# Altium footprint library hphonglib.PcbLib: 1250 footprints (part 70 of 79)
Each footprint in its own frame and in the unit in brackets; x right, y up, seen from the top. Pads: shape width x height; smd on the part's side, far side on the other; paste and mask are expansions set on the pad; w line width, h text height; cw(c..) or ccw(c..) is an arc to the next point about the centre after c.
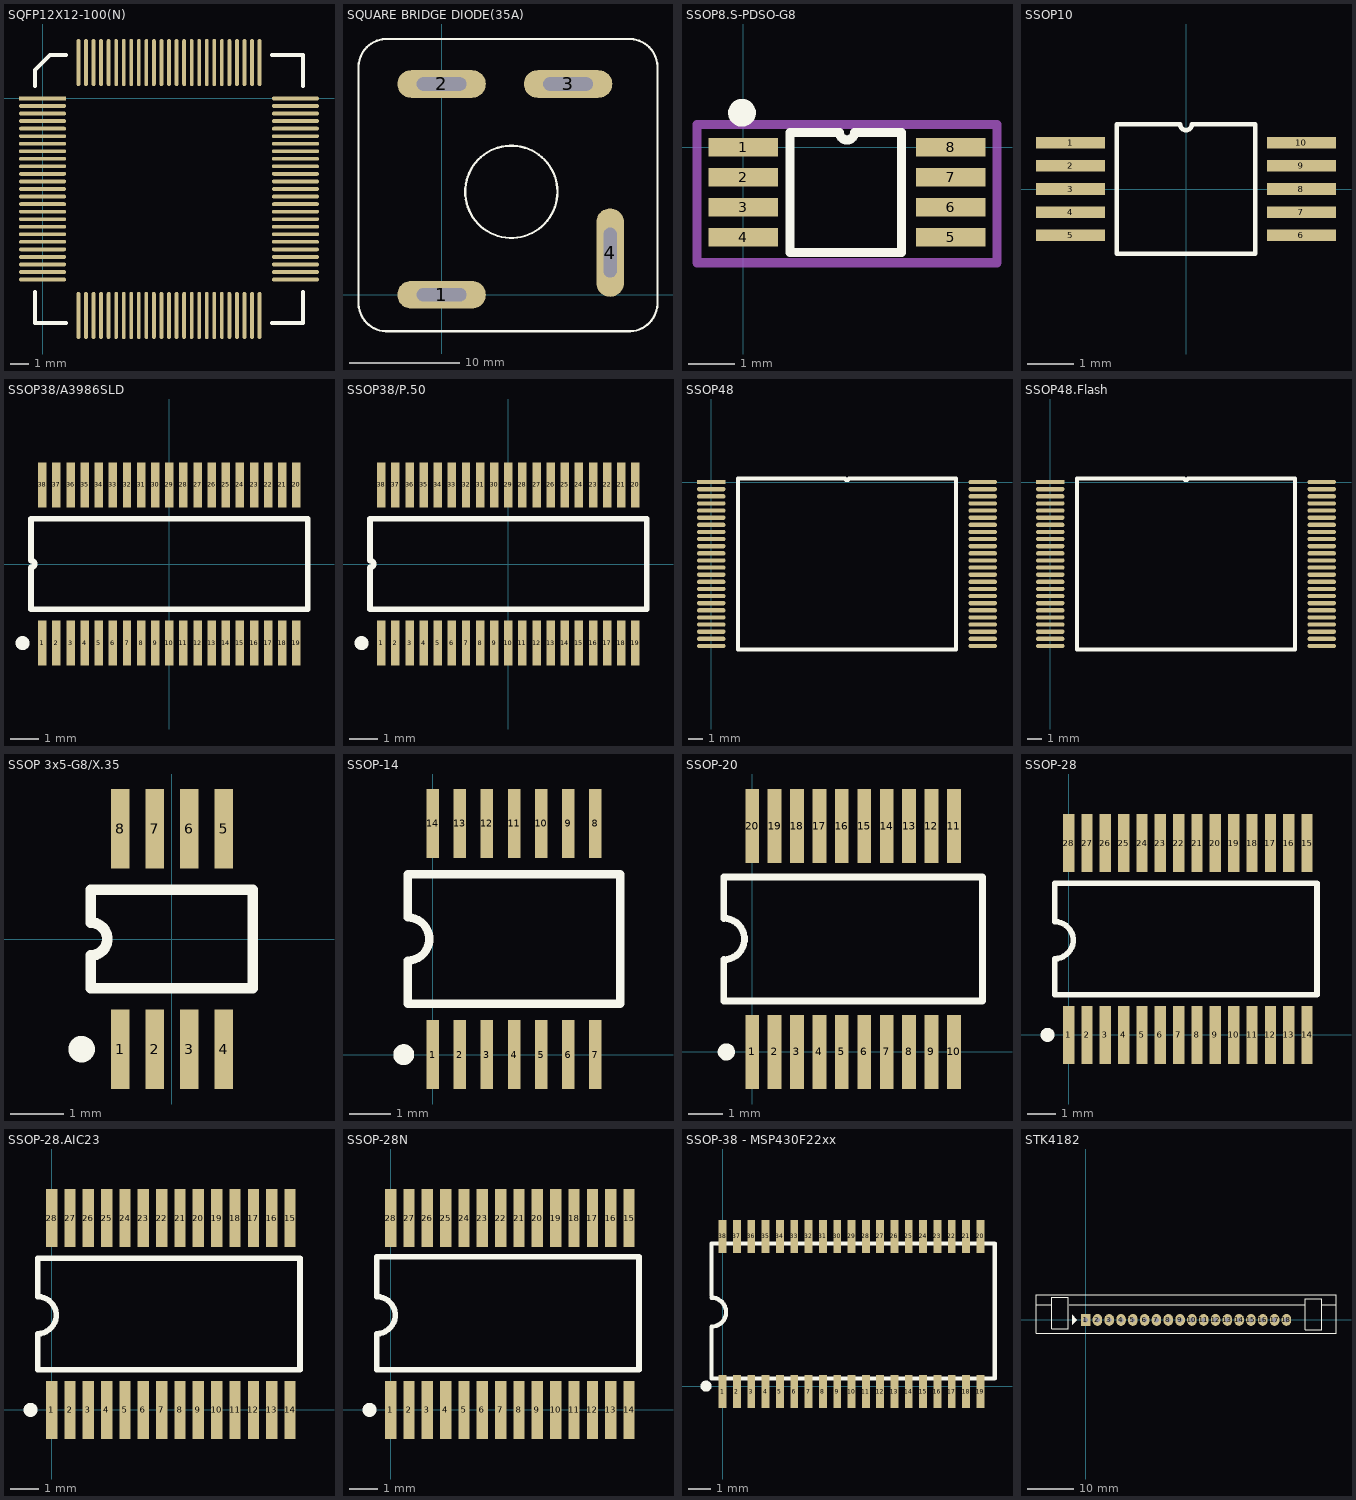
[diagram p69: the footprints below, top view; thin cyan lines are the x and y axes]

## SQFP12X12-100(N) [mm]
pads (100):
  rect 2.5x0.2 smd: 1(0,0)
  oval 2.5x0.2 smd: 2(0,-0.4) 3(0,-0.8) 4(0,-1.2) 5(0,-1.6) 6(0,-2) 7(0,-2.4) 8(0,-2.8) 9(0,-3.2) 10(0,-3.6) 11(0,-4) 12(0,-4.4) 13(0,-4.8) 14(0,-5.2) 15(0,-5.6) 16(0,-6) 17(0,-6.4) 18(0,-6.8) 19(0,-7.2) 20(0,-7.6) 21(0,-8) 22(0,-8.4) 23(0,-8.8) 24(0,-9.2) 25(0,-9.6) 51(13.4,-9.6) 52(13.4,-9.2) 53(13.4,-8.8) 54(13.4,-8.4) 55(13.4,-8) 56(13.4,-7.6) 57(13.4,-7.2) 58(13.4,-6.8) 59(13.4,-6.4) 60(13.4,-6) 61(13.4,-5.6) 62(13.4,-5.2) 63(13.4,-4.8) 64(13.4,-4.4) 65(13.4,-4) 66(13.4,-3.6) 67(13.4,-3.2) 68(13.4,-2.8) 69(13.4,-2.4) 70(13.4,-2) 71(13.4,-1.6) 72(13.4,-1.2) 73(13.4,-0.8) 74(13.4,-0.4) 75(13.4,0)
  oval 0.2x2.5 smd: 26(1.9,-11.5) 27(2.3,-11.5) 28(2.7,-11.5) 29(3.1,-11.5) 30(3.5,-11.5) 31(3.9,-11.5) 32(4.3,-11.5) 33(4.7,-11.5) 34(5.1,-11.5) 35(5.5,-11.5) 36(5.9,-11.5) 37(6.3,-11.5) 38(6.7,-11.5) 39(7.1,-11.5) 40(7.5,-11.5) 41(7.9,-11.5) 42(8.3,-11.5) 43(8.7,-11.5) 44(9.1,-11.5) 45(9.5,-11.5) 46(9.9,-11.5) 47(10.3,-11.5) 48(10.7,-11.5) 49(11.1,-11.5) 50(11.5,-11.5) 76(11.5,1.9) 77(11.1,1.9) 78(10.7,1.9) 79(10.3,1.9) 80(9.9,1.9) 81(9.5,1.9) 82(9.1,1.9) 83(8.7,1.9) 84(8.3,1.9) 85(7.9,1.9) 86(7.5,1.9) 87(7.1,1.9) 88(6.7,1.9) 89(6.3,1.9) 90(5.9,1.9) 91(5.5,1.9) 92(5.1,1.9) 93(4.7,1.9) 94(4.3,1.9) 95(3.9,1.9) 96(3.5,1.9) 97(3.1,1.9) 98(2.7,1.9) 99(2.3,1.9) 100(1.9,1.9)
Top Overlay:
  lines w0.2: -0.4,-10.25 -0.4,-11.9 1.25,-11.9 ; -0.4,0.65 -0.4,1.5 0.4,2.3 1.25,2.3 ; 12.15,-11.9 13.8,-11.9 13.8,-10.25 ; 12.15,2.3 13.8,2.3 13.8,0.65

## SQUARE BRIDGE DIODE(35A) [mm]
pads (4):
  oval 8x2.5 hole 1.2 slot 4.5 at 0 deg: 1(0,0) 2(0,19.05) 3(11.43,19.05)
  oval 2.5x8 hole 1.2 slot 4.5 at 90 deg: 4(15.24,3.81)
Top Overlay:
  circle w0.2: c6.303,9.304 r4.17
  lines w0.2: -7.504,-0.6 ccw(c-4.952,-0.75) -4.802,-3.302 16.808,-3.302 ccw(c16.958,-0.75) 19.509,-0.6 19.509,20.41 ccw(c16.958,20.56) 16.808,23.111 -4.802,23.111 ccw(c-4.952,20.56) -7.504,20.41 -7.504,-0.6
3D body "User Library-SquareDiodeBridge-L.step": height 8.05, standoff -11, extent -8.281,-4.217 20.219,24.283

## SSOP8.S-PDSO-G8 [mm]
pads (8):
  rect 1.5x0.4 smd: 1(0,0) 2(0,-0.65) 3(0,-1.3) 4(0,-1.95) 5(4.5,-1.95) 6(4.5,-1.3) 7(4.5,-0.65) 8(4.5,0)
Top Overlay:
  lines w0.2: 1.016,-2.275 1.016,0.325 2.088,0.325 ccw(c2.25,0.325) 2.412,0.325 3.429,0.325 3.429,-2.275 1.016,-2.275
  lines w0.3: 0.125,0.75 cw(c-0.025,0.75) 0.124,0.767
Mechanical 13:
  lines w0.2: -1,-2.5 5.5,-2.5 5.5,0.5 -1,0.5 -1,-2.5
3D body: height 1.2, standoff 1.1, extent 1.049,-0.23 1.549,0.27
3D body: height 1.1, standoff 0, extent 0.75,-2.475 3.75,0.525
3D body: height 0.2, standoff 0, extent -0.25,-0.175 0.75,0.175
3D body: height 0.2, standoff 0, extent 3.75,-2.125 4.75,-1.775
3D body: height 0.2, standoff 0, extent -0.25,-0.825 0.75,-0.475
3D body: height 0.2, standoff 0, extent -0.25,-1.475 0.75,-1.125
3D body: height 0.2, standoff 0, extent -0.25,-2.125 0.75,-1.775
3D body: height 0.2, standoff 0, extent 3.75,-0.175 4.75,0.175
3D body: height 0.2, standoff 0, extent 3.75,-0.825 4.75,-0.475
3D body: height 0.2, standoff 0, extent 3.75,-1.475 4.75,-1.125

## SSOP10 [mm] "Shrink Small Outline; 10 Leads; Body Width 3 mm; Pitch 0.5 mm"
pads (10):
  rect 1.5x0.25 smd: 1(-2.5,1) 2(-2.5,0.5) 3(-2.5,0) 4(-2.5,-0.5) 5(-2.5,-1) 6(2.5,-1) 7(2.5,-0.5) 8(2.5,0) 9(2.5,0.5) 10(2.5,1)
Top Overlay:
  lines w0.1: -0.15,1.4 -1.5,1.4 -1.5,-1.4 1.5,-1.4 1.5,1.4 0.15,1.4 ; -0.125,1.4 ccw(c0,1.4) 0.125,1.4

## SSOP38/A3986SLD [mm] "Shrink Small Outline; 38 Leads; Body Width 4.4 mm; Pitch 0.5 mm"
height 1.2
pads (38):
  rect 0.3x1.6 smd: 1(-4.5,-2.8) 2(-4,-2.8) 3(-3.5,-2.8) 4(-3,-2.8) 5(-2.5,-2.8) 6(-2,-2.8) 7(-1.5,-2.8) 8(-1,-2.8) 9(-0.5,-2.8) 10(0,-2.8) 11(0.5,-2.8) 12(1,-2.8) 13(1.5,-2.8) 14(2,-2.8) 15(2.5,-2.8) 16(3,-2.8) 17(3.5,-2.8) 18(4,-2.8) 19(4.5,-2.8) 20(4.5,2.8) 21(4,2.8) 22(3.5,2.8) 23(3,2.8) 24(2.5,2.8) 25(2,2.8) 26(1.5,2.8) 27(1,2.8) 28(0.5,2.8) 29(0,2.8) 30(-0.5,2.8) 31(-1,2.8) 32(-1.5,2.8) 33(-2,2.8) 34(-2.5,2.8) 35(-3,2.8) 36(-3.5,2.8) 37(-4,2.8) 38(-4.5,2.8)
Top Overlay:
  circle w0.25: c-5.2,-2.8 r0.125
  lines w0.2: -4.9,-1.6 4.9,-1.6 4.9,1.6 -4.9,1.6 -4.9,0.125 cw(c-4.9,0) -4.9,-0.125 -4.9,-1.6

## SSOP38/P.50 [mm] "Shrink Small Outline; 38 Leads; Body Width 4.4 mm; Pitch 0.5 mm"
height 1.2
pads (38):
  rect 0.3x1.6 smd: 1(-4.5,-2.8) 2(-4,-2.8) 3(-3.5,-2.8) 4(-3,-2.8) 5(-2.5,-2.8) 6(-2,-2.8) 7(-1.5,-2.8) 8(-1,-2.8) 9(-0.5,-2.8) 10(0,-2.8) 11(0.5,-2.8) 12(1,-2.8) 13(1.5,-2.8) 14(2,-2.8) 15(2.5,-2.8) 16(3,-2.8) 17(3.5,-2.8) 18(4,-2.8) 19(4.5,-2.8) 20(4.5,2.8) 21(4,2.8) 22(3.5,2.8) 23(3,2.8) 24(2.5,2.8) 25(2,2.8) 26(1.5,2.8) 27(1,2.8) 28(0.5,2.8) 29(0,2.8) 30(-0.5,2.8) 31(-1,2.8) 32(-1.5,2.8) 33(-2,2.8) 34(-2.5,2.8) 35(-3,2.8) 36(-3.5,2.8) 37(-4,2.8) 38(-4.5,2.8)
Top Overlay:
  circle w0.25: c-5.2,-2.8 r0.125
  lines w0.2: -4.9,-1.6 -4.9,-0.125 ccw(c-4.9,0) -4.9,0.125 -4.9,1.6 4.9,1.6 4.9,-1.6 -4.9,-1.6

## SSOP48 [mil]
pads (48):
  rect 80x12.2 smd: 1(0,0)
  oval 80x12.2 smd: 2(0,-20) 3(0,-40) 4(0,-60) 5(0,-80) 6(0,-100) 7(0,-120) 8(0,-140) 9(0,-160) 10(0,-180) 11(0,-200) 12(0,-220) 13(0,-240) 14(0,-260) 15(0,-280) 16(0,-300) 17(0,-320) 18(0,-340) 19(0,-360) 20(0,-380) 21(0,-400) 22(0,-420) 23(0,-440) 24(0,-460) 25(762,-460) 26(762,-440) 27(762,-420) 28(762,-400) 29(762,-380) 30(762,-360) 31(762,-340) 32(762,-320) 33(762,-300) 34(762,-280) 35(762,-260) 36(762,-240) 37(762,-220) 38(762,-200) 39(762,-180) 40(762,-160) 41(762,-140) 42(762,-120) 43(762,-100) 44(762,-80) 45(762,-60) 46(762,-40) 47(762,-20) 48(762,0)
Top Overlay:
  lines w10: 75,-470 75,10 376,10 ccw(c381,10) 386,10 687,10 687,-470 75,-470
3D body: height 3.94, standoff 0.2, extent 745,-5 775,5
3D body: height 3.94, standoff 0.2, extent -15,-5 15,5
3D body: height 3.94, standoff 0.2, extent 745,-25 775,-15
3D body: height 3.94, standoff 0.2, extent 745,-45 775,-35
3D body: height 3.94, standoff 0.2, extent 745,-105 775,-95
3D body: height 3.94, standoff 0.2, extent 745,-85 775,-75
3D body: height 3.94, standoff 0.2, extent 745,-65 775,-55
3D body: height 3.94, standoff 0.2, extent 745,-165 775,-155
3D body: height 3.94, standoff 0.2, extent 745,-145 775,-135
3D body: height 3.94, standoff 0.2, extent 745,-125 775,-115
3D body: height 3.94, standoff 0.2, extent 745,-225 775,-215
3D body: height 3.94, standoff 0.2, extent 745,-205 775,-195
3D body: height 3.94, standoff 0.2, extent 745,-185 775,-175
3D body: height 3.94, standoff 0.2, extent 745,-285 775,-275
3D body: height 3.94, standoff 0.2, extent 745,-265 775,-255
3D body: height 3.94, standoff 0.2, extent 745,-245 775,-235
3D body: height 3.94, standoff 0.2, extent 745,-345 775,-335
3D body: height 3.94, standoff 0.2, extent 745,-325 775,-315
3D body: height 3.94, standoff 0.2, extent 745,-305 775,-295
3D body: height 3.94, standoff 0.2, extent 745,-405 775,-395
3D body: height 3.94, standoff 0.2, extent 745,-385 775,-375
3D body: height 3.94, standoff 0.2, extent 745,-365 775,-355
3D body: height 3.94, standoff 0.2, extent 745,-465 775,-455
3D body: height 3.94, standoff 0.2, extent 745,-445 775,-435
3D body: height 3.94, standoff 0.2, extent 745,-425 775,-415
3D body: height 3.94, standoff 0.2, extent -15,-25 15,-15
3D body: height 3.94, standoff 0.2, extent -15,-65 15,-55
3D body: height 3.94, standoff 0.2, extent -15,-45 15,-35
3D body: height 3.94, standoff 0.2, extent -15,-125 15,-115
3D body: height 3.94, standoff 0.2, extent -15,-145 15,-135
3D body: height 3.94, standoff 0.2, extent -15,-105 15,-95
3D body: height 3.94, standoff 0.2, extent -15,-85 15,-75
3D body: height 3.94, standoff 0.2, extent -15,-205 15,-195
3D body: height 3.94, standoff 0.2, extent -15,-225 15,-215
3D body: height 3.94, standoff 0.2, extent -15,-185 15,-175
3D body: height 3.94, standoff 0.2, extent -15,-165 15,-155
3D body: height 3.94, standoff 0.2, extent -15,-285 15,-275
3D body: height 3.94, standoff 0.2, extent -15,-305 15,-295
3D body: height 3.94, standoff 0.2, extent -15,-265 15,-255
3D body: height 3.94, standoff 0.2, extent -15,-245 15,-235
3D body: height 3.94, standoff 0.2, extent -15,-365 15,-355
3D body: height 3.94, standoff 0.2, extent -15,-385 15,-375
3D body: height 3.94, standoff 0.2, extent -15,-345 15,-335
3D body: height 3.94, standoff 0.2, extent -15,-325 15,-315
3D body: height 3.94, standoff 0.2, extent -15,-445 15,-435
3D body: height 3.94, standoff 0.2, extent -15,-465 15,-455
3D body: height 3.94, standoff 0.2, extent -15,-425 15,-415
3D body: height 3.94, standoff 0.2, extent -15,-405 15,-395
3D body: height 47.24, standoff 1.97, extent 15,-470 745,10
3D body: height 47.64, standoff 46.85, extent 42.47,-46.67 72.47,-16.67

## SSOP48.Flash [mil]
pads (48):
  rect 80x12.2 smd: 1(0,0)
  oval 80x12.2 smd: 2(0,-20) 3(0,-40) 4(0,-60) 5(0,-80) 6(0,-100) 7(0,-120) 8(0,-140) 9(0,-160) 10(0,-180) 11(0,-200) 12(0,-220) 13(0,-240) 14(0,-260) 15(0,-280) 16(0,-300) 17(0,-320) 18(0,-340) 19(0,-360) 20(0,-380) 21(0,-400) 22(0,-420) 23(0,-440) 24(0,-460) 25(762,-460) 26(762,-440) 27(762,-420) 28(762,-400) 29(762,-380) 30(762,-360) 31(762,-340) 32(762,-320) 33(762,-300) 34(762,-280) 35(762,-260) 36(762,-240) 37(762,-220) 38(762,-200) 39(762,-180) 40(762,-160) 41(762,-140) 42(762,-120) 43(762,-100) 44(762,-80) 45(762,-60) 46(762,-40) 47(762,-20) 48(762,0)
Top Overlay:
  lines w10: 75,-470 75,10 376,10 ccw(c381,10) 386,10 687,10 687,-470 75,-470
3D body: height 3.94, standoff 0.2, extent 745,-5 775,5
3D body: height 3.94, standoff 0.2, extent -15,-5 15,5
3D body: height 3.94, standoff 0.2, extent 745,-25 775,-15
3D body: height 3.94, standoff 0.2, extent 745,-45 775,-35
3D body: height 3.94, standoff 0.2, extent 745,-105 775,-95
3D body: height 3.94, standoff 0.2, extent 745,-85 775,-75
3D body: height 3.94, standoff 0.2, extent 745,-65 775,-55
3D body: height 3.94, standoff 0.2, extent 745,-165 775,-155
3D body: height 3.94, standoff 0.2, extent 745,-145 775,-135
3D body: height 3.94, standoff 0.2, extent 745,-125 775,-115
3D body: height 3.94, standoff 0.2, extent 745,-225 775,-215
3D body: height 3.94, standoff 0.2, extent 745,-205 775,-195
3D body: height 3.94, standoff 0.2, extent 745,-185 775,-175
3D body: height 3.94, standoff 0.2, extent 745,-285 775,-275
3D body: height 3.94, standoff 0.2, extent 745,-265 775,-255
3D body: height 3.94, standoff 0.2, extent 745,-245 775,-235
3D body: height 3.94, standoff 0.2, extent 745,-345 775,-335
3D body: height 3.94, standoff 0.2, extent 745,-325 775,-315
3D body: height 3.94, standoff 0.2, extent 745,-305 775,-295
3D body: height 3.94, standoff 0.2, extent 745,-405 775,-395
3D body: height 3.94, standoff 0.2, extent 745,-385 775,-375
3D body: height 3.94, standoff 0.2, extent 745,-365 775,-355
3D body: height 3.94, standoff 0.2, extent 745,-465 775,-455
3D body: height 3.94, standoff 0.2, extent 745,-445 775,-435
3D body: height 3.94, standoff 0.2, extent 745,-425 775,-415
3D body: height 3.94, standoff 0.2, extent -15,-25 15,-15
3D body: height 3.94, standoff 0.2, extent -15,-65 15,-55
3D body: height 3.94, standoff 0.2, extent -15,-45 15,-35
3D body: height 3.94, standoff 0.2, extent -15,-125 15,-115
3D body: height 3.94, standoff 0.2, extent -15,-145 15,-135
3D body: height 3.94, standoff 0.2, extent -15,-105 15,-95
3D body: height 3.94, standoff 0.2, extent -15,-85 15,-75
3D body: height 3.94, standoff 0.2, extent -15,-205 15,-195
3D body: height 3.94, standoff 0.2, extent -15,-225 15,-215
3D body: height 3.94, standoff 0.2, extent -15,-185 15,-175
3D body: height 3.94, standoff 0.2, extent -15,-165 15,-155
3D body: height 3.94, standoff 0.2, extent -15,-285 15,-275
3D body: height 3.94, standoff 0.2, extent -15,-305 15,-295
3D body: height 3.94, standoff 0.2, extent -15,-265 15,-255
3D body: height 3.94, standoff 0.2, extent -15,-245 15,-235
3D body: height 3.94, standoff 0.2, extent -15,-365 15,-355
3D body: height 3.94, standoff 0.2, extent -15,-385 15,-375
3D body: height 3.94, standoff 0.2, extent -15,-345 15,-335
3D body: height 3.94, standoff 0.2, extent -15,-325 15,-315
3D body: height 3.94, standoff 0.2, extent -15,-445 15,-435
3D body: height 3.94, standoff 0.2, extent -15,-465 15,-455
3D body: height 3.94, standoff 0.2, extent -15,-425 15,-415
3D body: height 3.94, standoff 0.2, extent -15,-405 15,-395
3D body: height 47.24, standoff 1.97, extent 15.75,-470.47 746.06,9.84
3D body: height 47.28, standoff 46.85, extent 42.47,-46.67 72.47,-16.67
3D body: height 47.28, standoff 46.85, extent 334.65,-316.93 384.84,-247.05
3D body: height 47.28, standoff 46.85, extent 363.19,-218.5 413.39,-148.62
3D body: height 47.28, standoff 46.85, extent 243.11,-218.5 293.31,-148.62
3D body: height 47.28, standoff 46.85, extent 303.15,-218.5 353.35,-148.62
3D body: height 47.28, standoff 46.85, extent 423.23,-218.5 473.43,-148.62
3D body: height 47.28, standoff 46.85, extent 483.27,-218.5 533.46,-148.62
3D body: height 47.28, standoff 46.85, extent 284.45,-316.93 313.98,-247.05
3D body: height 47.28, standoff 46.85, extent 394.69,-316.93 444.88,-247.05
3D body: height 47.28, standoff 46.85, extent 454.72,-316.93 503.94,-247.05

## SSOP 3x5-G8/X.35 [mm] "Shrink Small Outline; 8 Leads; Body Width 3 mm; Pitch 0.65 mm"
pads (8):
  rect 0.35x1.5 smd: 1(-0.975,-2.075) 2(-0.325,-2.075) 3(0.325,-2.075) 4(0.975,-2.075) 5(0.975,2.075) 6(0.325,2.075) 7(-0.325,2.075) 8(-0.975,2.075)
Top Overlay:
  circle w0.25: c-1.7,-2.075 r0.125
  lines w0.2: -1.525,-0.925 1.525,-0.925 1.525,0.925 -1.525,0.925 -1.525,0.308 cw(c-1.525,0) -1.525,-0.308 -1.525,-0.925

## SSOP-14 [mm] "Shrink Small Outline, Plastic, Thin; 14 Leads; Body Width 4.4 mm; Pitch 0.65 mm"
height 1.1
pads (14):
  rect 0.3x1.65 smd: 1(0,0) 2(0.65,0) 3(1.3,0) 4(1.95,0) 5(2.6,0) 6(3.25,0) 7(3.9,0) 8(3.9,5.55) 9(3.25,5.55) 10(2.6,5.55) 11(1.95,5.55) 12(1.3,5.55) 13(0.65,5.55) 14(0,5.55)
Top Overlay:
  circle w0.25: c-0.7,0 r0.125
  lines w0.2: -0.6,1.225 4.5,1.225 4.5,4.325 -0.6,4.325 -0.6,3.292 cw(c-0.6,2.775) -0.6,2.258 -0.6,1.225

## SSOP-20 [mm] "SSOP, Plastic; 20 Leads; Body Width 5.3 mm; Pitch 0.65 mm"
height 1.99
pads (20):
  rect 0.4x2.15 smd: 1(0,0) 2(0.65,0) 3(1.3,0) 4(1.95,0) 5(2.6,0) 6(3.25,0) 7(3.9,0) 8(4.55,0) 9(5.2,0) 10(5.85,0) 11(5.85,6.55) 12(5.2,6.55) 13(4.55,6.55) 14(3.9,6.55) 15(3.25,6.55) 16(2.6,6.55) 17(1.95,6.55) 18(1.3,6.55) 19(0.65,6.55) 20(0,6.55)
Top Overlay:
  circle w0.25: c-0.75,0 r0.125
  lines w0.2: -0.825,1.475 -0.825,2.675 ccw(c-0.825,3.275) -0.825,3.875 -0.825,5.075 6.675,5.075 6.675,1.475 -0.825,1.475
3D body "SSOP_20.STEP": height 1.79, standoff -0.05, extent -0.75,-0.675 6.55,7.225

## SSOP-28 [mm] "SSOP, Plastic; 28 Leads; Body Width 5.2 mm; Pitch 0.65 mm"
height 1.99
pads (28):
  rect 0.4x2.05 smd: 1(0,0) 2(0.65,0) 3(1.3,0) 4(1.95,0) 5(2.6,0) 6(3.25,0) 7(3.9,0) 8(4.55,0) 9(5.2,0) 10(5.85,0) 11(6.5,0) 12(7.15,0) 13(7.8,0) 14(8.45,0) 15(8.45,6.8) 16(7.8,6.8) 17(7.15,6.8) 18(6.5,6.8) 19(5.85,6.8) 20(5.2,6.8) 21(4.55,6.8) 22(3.9,6.8) 23(3.25,6.8) 24(2.6,6.8) 25(1.95,6.8) 26(1.3,6.8) 27(0.65,6.8) 28(0,6.8)
Top Overlay:
  circle w0.25: c-0.75,0 r0.125
  lines w0.2: -0.5,4.017 cw(c-0.5,3.358) -0.5,2.7 -0.5,1.425 8.8,1.425 8.8,5.375 -0.5,5.375 -0.5,4.1
3D body: height 1.2, standoff 0.15, extent -0.7,1.15 9.1,5.65
3D body: height 0.1, standoff 0, extent -0.15,0.1 0.15,1.2
3D body: height 0.1, standoff 0, extent 0.5,0.1 0.8,1.2
3D body: height 0.1, standoff 0, extent 1.15,0.1 1.45,1.2
3D body: height 0.1, standoff 0, extent 1.8,0.1 2.1,1.2
3D body: height 0.1, standoff 0, extent 4.4,0.1 4.7,1.2
3D body: height 0.1, standoff 0, extent 3.75,0.1 4.05,1.2
3D body: height 0.1, standoff 0, extent 3.1,0.1 3.4,1.2
3D body: height 0.1, standoff 0, extent 2.45,0.1 2.75,1.2
3D body: height 0.1, standoff 0, extent 7,0.1 7.3,1.2
3D body: height 0.1, standoff 0, extent 6.35,0.1 6.65,1.2
3D body: height 0.1, standoff 0, extent 5.7,0.1 6,1.2
3D body: height 0.1, standoff 0, extent 5.05,0.1 5.35,1.2
3D body: height 0.1, standoff 0, extent 8.3,0.1 8.6,1.2
3D body: height 0.1, standoff 0, extent 7.65,0.1 7.95,1.2
3D body: height 0.1, standoff 0, extent 6.35,5.6 6.65,6.7
3D body: height 0.1, standoff 0, extent 7,5.6 7.3,6.7
3D body: height 0.1, standoff 0, extent 7.65,5.6 7.95,6.7
3D body: height 0.1, standoff 0, extent 8.3,5.6 8.6,6.7
3D body: height 0.1, standoff 0, extent 3.75,5.6 4.05,6.7
3D body: height 0.1, standoff 0, extent 4.4,5.6 4.7,6.7
3D body: height 0.1, standoff 0, extent 5.05,5.6 5.35,6.7
3D body: height 0.1, standoff 0, extent 5.7,5.6 6,6.7
3D body: height 0.1, standoff 0, extent 1.15,5.6 1.45,6.7
3D body: height 0.1, standoff 0, extent 1.8,5.6 2.1,6.7
3D body: height 0.1, standoff 0, extent 2.45,5.6 2.75,6.7
3D body: height 0.1, standoff 0, extent 3.1,5.6 3.4,6.7
3D body: height 0.1, standoff 0, extent -0.15,5.6 0.15,6.7
3D body: height 0.1, standoff 0, extent 0.5,5.6 0.8,6.7
3D body: height 1.2, standoff 1.19, extent 6.5,2.525 7.775,4.3
3D body: height 1.2, standoff 1.19, extent 4.975,2.525 6.25,4.3
3D body: height 1.2, standoff 1.19, extent 3.475,2.525 4.725,4.3
3D body: height 1.2, standoff 1.19, extent 2.2,2.525 2.95,4.3
3D body: height 1.2, standoff 1.19, extent 0.675,2.525 1.95,4.3

## SSOP-28.AIC23 [mm] "SSOP, Plastic; 28 Leads; Body Width 5.2 mm; Pitch 0.65 mm"
height 1.99
pads (28):
  rect 0.4x2.05 smd: 1(0,0) 2(0.65,0) 3(1.3,0) 4(1.95,0) 5(2.6,0) 6(3.25,0) 7(3.9,0) 8(4.55,0) 9(5.2,0) 10(5.85,0) 11(6.5,0) 12(7.15,0) 13(7.8,0) 14(8.45,0) 15(8.45,6.8) 16(7.8,6.8) 17(7.15,6.8) 18(6.5,6.8) 19(5.85,6.8) 20(5.2,6.8) 21(4.55,6.8) 22(3.9,6.8) 23(3.25,6.8) 24(2.6,6.8) 25(1.95,6.8) 26(1.3,6.8) 27(0.65,6.8) 28(0,6.8)
Top Overlay:
  circle w0.25: c-0.75,0 r0.125
  lines w0.2: -0.5,4.017 cw(c-0.5,3.358) -0.5,2.7 -0.5,1.425 8.8,1.425 8.8,5.375 -0.5,5.375 -0.5,4.1
3D body: height 0.1, standoff 0, extent 0.5,5.6 0.8,6.7
3D body: height 0.1, standoff 0, extent -0.15,5.6 0.15,6.7
3D body: height 0.1, standoff 0, extent 3.1,5.6 3.4,6.7
3D body: height 0.1, standoff 0, extent 2.45,5.6 2.75,6.7
3D body: height 0.1, standoff 0, extent 1.8,5.6 2.1,6.7
3D body: height 0.1, standoff 0, extent 1.15,5.6 1.45,6.7
3D body: height 0.1, standoff 0, extent 5.7,5.6 6,6.7
3D body: height 0.1, standoff 0, extent 5.05,5.6 5.35,6.7
3D body: height 0.1, standoff 0, extent 4.4,5.6 4.7,6.7
3D body: height 0.1, standoff 0, extent 3.75,5.6 4.05,6.7
3D body: height 0.1, standoff 0, extent 8.3,5.6 8.6,6.7
3D body: height 0.1, standoff 0, extent 7.65,5.6 7.95,6.7
3D body: height 0.1, standoff 0, extent 7,5.6 7.3,6.7
3D body: height 0.1, standoff 0, extent 6.35,5.6 6.65,6.7
3D body: height 0.1, standoff 0, extent 7.65,0.1 7.95,1.2
3D body: height 0.1, standoff 0, extent 8.3,0.1 8.6,1.2
3D body: height 0.1, standoff 0, extent 5.05,0.1 5.35,1.2
3D body: height 0.1, standoff 0, extent 5.7,0.1 6,1.2
3D body: height 0.1, standoff 0, extent 6.35,0.1 6.65,1.2
3D body: height 0.1, standoff 0, extent 7,0.1 7.3,1.2
3D body: height 0.1, standoff 0, extent 2.45,0.1 2.75,1.2
3D body: height 0.1, standoff 0, extent 3.1,0.1 3.4,1.2
3D body: height 0.1, standoff 0, extent 3.75,0.1 4.05,1.2
3D body: height 0.1, standoff 0, extent 4.4,0.1 4.7,1.2
3D body: height 0.1, standoff 0, extent 1.8,0.1 2.1,1.2
3D body: height 0.1, standoff 0, extent 1.15,0.1 1.45,1.2
3D body: height 0.1, standoff 0, extent 0.5,0.1 0.8,1.2
3D body: height 0.1, standoff 0, extent -0.15,0.1 0.15,1.2
3D body: height 1.2, standoff 0.15, extent -0.7,1.15 9.1,5.65
3D body: height 1.2, standoff 1.19, extent 0.675,2.525 1.95,4.3
3D body: height 1.2, standoff 1.19, extent 2.2,2.525 2.95,4.3
3D body: height 1.2, standoff 1.19, extent 3.475,2.525 4.725,4.3
3D body: height 1.2, standoff 1.19, extent 4.975,2.525 6.25,4.3
3D body: height 1.2, standoff 1.19, extent 6.5,2.525 7.775,4.3

## SSOP-28N [mm] "SSOP, Plastic; 28 Leads; Body Width 5.2 mm; Pitch 0.65 mm"
height 1.99
pads (28):
  rect 0.4x2.05 smd: 1(0,0) 2(0.65,0) 3(1.3,0) 4(1.95,0) 5(2.6,0) 6(3.25,0) 7(3.9,0) 8(4.55,0) 9(5.2,0) 10(5.85,0) 11(6.5,0) 12(7.15,0) 13(7.8,0) 14(8.45,0) 15(8.45,6.8) 16(7.8,6.8) 17(7.15,6.8) 18(6.5,6.8) 19(5.85,6.8) 20(5.2,6.8) 21(4.55,6.8) 22(3.9,6.8) 23(3.25,6.8) 24(2.6,6.8) 25(1.95,6.8) 26(1.3,6.8) 27(0.65,6.8) 28(0,6.8)
Top Overlay:
  circle w0.25: c-0.75,0 r0.125
  lines w0.2: -0.5,4.017 cw(c-0.5,3.358) -0.5,2.7 -0.5,1.425 8.8,1.425 8.8,5.375 ; -0.5,4.1 -0.5,5.375 ; -0.5,5.425 8.8,5.425
3D body "SSOP-28.STEP": height 1.92, standoff -0.03, extent -1.025,-0.725 9.475,7.5

## SSOP-38 - MSP430F22xx [mm] "SSOP, Plastic; 38 Leads; Body Width 5.2 mm; Pitch 0.65 mm"
height 1.99
pads (38):
  rect 0.356x1.5 smd: 1(0,-0.25) 2(0.65,-0.25) 3(1.3,-0.25) 4(1.95,-0.25) 5(2.6,-0.25) 6(3.25,-0.25) 7(3.9,-0.25) 8(4.55,-0.25) 9(5.2,-0.25) 10(5.85,-0.25) 11(6.5,-0.25) 12(7.15,-0.25) 13(7.8,-0.25) 14(8.45,-0.25) 15(9.1,-0.25) 16(9.75,-0.25) 17(10.4,-0.25) 18(11.05,-0.25) 19(11.7,-0.25) 20(11.7,6.8) 21(11.05,6.8) 22(10.4,6.8) 23(9.75,6.8) 24(9.1,6.8) 25(8.45,6.8) 26(7.8,6.8) 27(7.15,6.8) 28(6.5,6.8) 29(5.85,6.8) 30(5.2,6.8) 31(4.55,6.8) 32(3.9,6.8) 33(3.25,6.8) 34(2.6,6.8) 35(1.95,6.8) 36(1.3,6.8) 37(0.65,6.8) 38(0,6.8)
Top Overlay:
  circle w0.25: c-0.75,0 r0.125
  lines w0.2: -0.5,4.017 cw(c-0.5,3.358) -0.5,2.7 -0.5,0.35 12.35,0.35 12.35,6.475 -0.5,6.475 -0.5,4.1

## STK4182 [mil] "Pin to pin 100mil, 18 pin"
pads (18):
  rect 80x100 hole 40: 1(0,0)
  oval 80x100 hole 40: 2(100,0) 3(200,0) 4(300,0) 5(400,0) 6(500,0) 7(600,0) 8(700,0) 9(800,0) 10(900,0) 11(1000,0) 12(1100,0) 13(1200,0) 14(1300,0) 15(1400,0) 16(1500,0) 17(1600,0) 18(1700,0)
Top Overlay:
  region: -115,42.5 -115,-42.5 -75,-2.5 -75,2.5
  lines w10: -420,130 -285,130 ; -140,130 1860,130 ; 2000,130 2120,130 ; -420,-115 -420,215 2120,215 2120,-115 -420,-115 ; -285,-75 -145,-75 -145,190 -285,190 -285,-75 ; 1860,-85 1860,180 2000,180 2000,-85 1860,-85